# Altium schematic symbol library jlcpcb_2025_04_resistors_extended_0201.schlib: 1508 symbols (part 3 of 8) (continued)
## AF0201FR-07392KL
designator R?  Resistance: 392kΩ  (hidden comment: *)
Resistor, 392kΩ, ±1%, 50mW, 25V, ±200ppm/℃, -55℃~+155℃, SMD 0201; Manufacturer: Uniroyal; Manufacturer Part Number: AF0201FR-07392KL; Supplier 1: LCSC; Supplier Part Number 1: C143990; JLCPCB Part Number: C143990; Power Rating: 50mW; Category: Resistors; Package Size: 0201; JLCPCB Basic Part: Yes; Tolerance: ±1%; Voltage Rating: 25V; Temperature Coefficient: ±200ppm/℃; Temperature Rating: -55℃~+155℃; ComponentLink1Description: Datasheet; ComponentLink1URL: https://wmsc.lcsc.com/wmsc/upload/file/pdf/v2/lcsc/2304140030_YAGEO-AF0201FR-07392KL_C143990.pdf; ComponentLink2Description: JLCPCB Part URL; ComponentLink2URL: https://jlcpcb.com/partdetail/C143990
pins: 1, 2
1 alternate drawing of the same symbol

## AF0201FR-07422KL
designator R?  Resistance: 422kΩ  (hidden comment: *)
Resistor, 422kΩ, ±1%, 50mW, 25V, ±200ppm/℃, -55℃~+155℃, SMD 0201; Manufacturer: Uniroyal; Manufacturer Part Number: AF0201FR-07422KL; Supplier 1: LCSC; Supplier Part Number 1: C143991; JLCPCB Part Number: C143991; Power Rating: 50mW; Category: Resistors; Package Size: 0201; JLCPCB Basic Part: Yes; Tolerance: ±1%; Voltage Rating: 25V; Temperature Coefficient: ±200ppm/℃; Temperature Rating: -55℃~+155℃; ComponentLink1Description: Datasheet; ComponentLink1URL: https://wmsc.lcsc.com/wmsc/upload/file/pdf/v2/lcsc/2304140030_YAGEO-AF0201FR-07422KL_C143991.pdf; ComponentLink2Description: JLCPCB Part URL; ComponentLink2URL: https://jlcpcb.com/partdetail/C143991
pins: 1, 2
1 alternate drawing of the same symbol

## AF0201FR-07475RL
designator R?  Resistance: 475Ω  (hidden comment: *)
Resistor, 475Ω, ±1%, 50mW, 25V, ±200ppm/℃, -55℃~+155℃, SMD 0201; Manufacturer: Uniroyal; Manufacturer Part Number: AF0201FR-07475RL; Supplier 1: LCSC; Supplier Part Number 1: C143992; JLCPCB Part Number: C143992; Power Rating: 50mW; Category: Resistors; Package Size: 0201; JLCPCB Basic Part: Yes; Tolerance: ±1%; Voltage Rating: 25V; Temperature Coefficient: ±200ppm/℃; Temperature Rating: -55℃~+155℃; ComponentLink1Description: Datasheet; ComponentLink1URL: https://wmsc.lcsc.com/wmsc/upload/file/pdf/v2/lcsc/2304140030_YAGEO-AF0201FR-07475RL_C143992.pdf; ComponentLink2Description: JLCPCB Part URL; ComponentLink2URL: https://jlcpcb.com/partdetail/C143992
pins: 1, 2
1 alternate drawing of the same symbol

## AF0201JR-077K5L
designator R?  Resistance: 7.5kΩ  (hidden comment: *)
Resistor, 7.5kΩ, ±5%, 50mW, 25V, ±200ppm/℃, -55℃~+155℃, SMD 0201; Manufacturer: Uniroyal; Manufacturer Part Number: AF0201JR-077K5L; Supplier 1: LCSC; Supplier Part Number 1: C144029; JLCPCB Part Number: C144029; Power Rating: 50mW; Category: Resistors; Package Size: 0201; JLCPCB Basic Part: Yes; Tolerance: ±5%; Voltage Rating: 25V; Temperature Coefficient: ±200ppm/℃; Temperature Rating: -55℃~+155℃; ComponentLink1Description: Datasheet; ComponentLink1URL: https://wmsc.lcsc.com/wmsc/upload/file/pdf/v2/lcsc/2304140030_YAGEO-AF0201JR-077K5L_C144029.pdf; ComponentLink2Description: JLCPCB Part URL; ComponentLink2URL: https://jlcpcb.com/partdetail/C144029
pins: 1, 2
1 alternate drawing of the same symbol

## AF0201JR-0715KL
designator R?  Resistance: 15kΩ  (hidden comment: *)
Resistor, 15kΩ, ±5%, 50mW, 25V, ±200ppm/℃, -55℃~+125℃, SMD 0201; Manufacturer: Uniroyal; Manufacturer Part Number: AF0201JR-0715KL; Supplier 1: LCSC; Supplier Part Number 1: C144002; JLCPCB Part Number: C144002; Power Rating: 50mW; Category: Resistors; Package Size: 0201; JLCPCB Basic Part: Yes; Tolerance: ±5%; Voltage Rating: 25V; Temperature Coefficient: ±200ppm/℃; Temperature Rating: -55℃~+125℃; ComponentLink1Description: Datasheet; ComponentLink1URL: https://wmsc.lcsc.com/wmsc/upload/file/pdf/v2/lcsc/2304140030_YAGEO-AF0201JR-0715KL_C144002.pdf; ComponentLink2Description: JLCPCB Part URL; ComponentLink2URL: https://jlcpcb.com/partdetail/C144002
pins: 1, 2
1 alternate drawing of the same symbol

## AF0201JR-0720KL
designator R?  Resistance: 20kΩ  (hidden comment: *)
Resistor, 20kΩ, ±5%, 50mW, 25V, ±200ppm/℃, -55℃~+125℃, SMD 0201; Manufacturer: Uniroyal; Manufacturer Part Number: AF0201JR-0720KL; Supplier 1: LCSC; Supplier Part Number 1: C144008; JLCPCB Part Number: C144008; Power Rating: 50mW; Category: Resistors; Package Size: 0201; JLCPCB Basic Part: Yes; Tolerance: ±5%; Voltage Rating: 25V; Temperature Coefficient: ±200ppm/℃; Temperature Rating: -55℃~+125℃; ComponentLink1Description: Datasheet; ComponentLink1URL: https://wmsc.lcsc.com/wmsc/upload/file/pdf/v2/lcsc/2304140030_YAGEO-AF0201JR-0720KL_C144008.pdf; ComponentLink2Description: JLCPCB Part URL; ComponentLink2URL: https://jlcpcb.com/partdetail/C144008
pins: 1, 2
1 alternate drawing of the same symbol

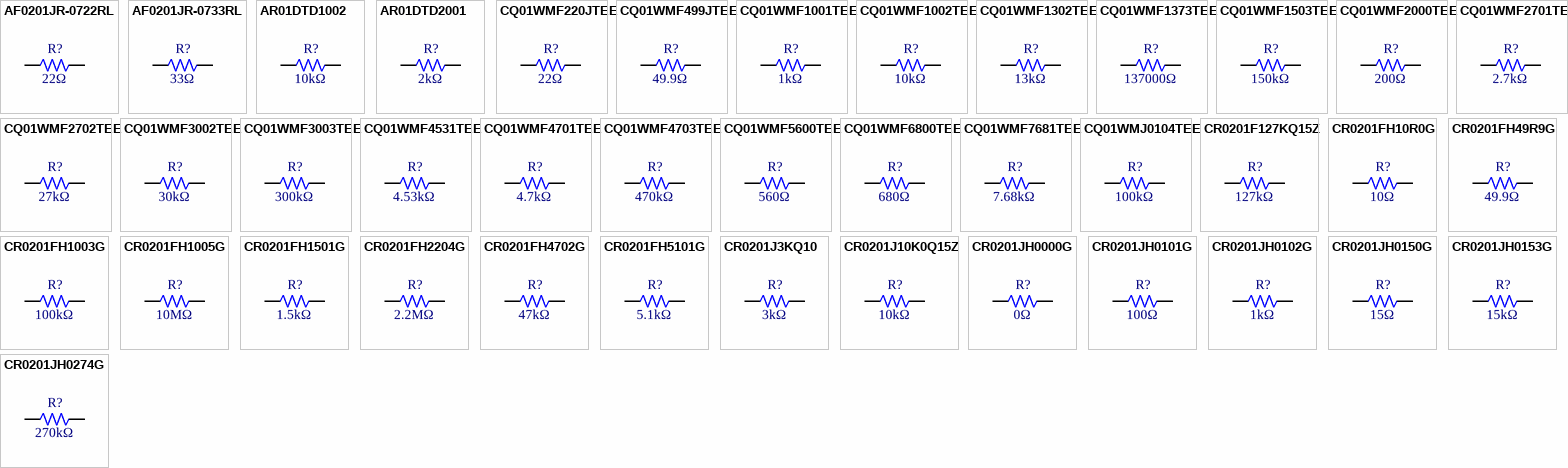
[diagram p11: symbols AF0201JR-0722RL to CR0201JH0274G]

## AF0201JR-0722RL
designator R?  Resistance: 22Ω  (hidden comment: *)
Resistor, 22Ω, ±5%, 50mW, 25V, ±200ppm/℃, -55℃~+125℃, SMD 0201; Manufacturer: Uniroyal; Manufacturer Part Number: AF0201JR-0722RL; Supplier 1: LCSC; Supplier Part Number 1: C144010; JLCPCB Part Number: C144010; Power Rating: 50mW; Category: Resistors; Package Size: 0201; JLCPCB Basic Part: Yes; Tolerance: ±5%; Voltage Rating: 25V; Temperature Coefficient: ±200ppm/℃; Temperature Rating: -55℃~+125℃; ComponentLink1Description: Datasheet; ComponentLink1URL: https://wmsc.lcsc.com/wmsc/upload/file/pdf/v2/lcsc/2304140030_YAGEO-AF0201JR-0722RL_C144010.pdf; ComponentLink2Description: JLCPCB Part URL; ComponentLink2URL: https://jlcpcb.com/partdetail/C144010
pins: 1, 2
1 alternate drawing of the same symbol

## AF0201JR-0733RL
designator R?  Resistance: 33Ω  (hidden comment: *)
Resistor, 33Ω, ±5%, 50mW, 25V, ±200ppm/℃, -55℃~+125℃, SMD 0201; Manufacturer: Uniroyal; Manufacturer Part Number: AF0201JR-0733RL; Supplier 1: LCSC; Supplier Part Number 1: C144015; JLCPCB Part Number: C144015; Power Rating: 50mW; Category: Resistors; Package Size: 0201; JLCPCB Basic Part: Yes; Tolerance: ±5%; Voltage Rating: 25V; Temperature Coefficient: ±200ppm/℃; Temperature Rating: -55℃~+125℃; ComponentLink1Description: Datasheet; ComponentLink1URL: https://wmsc.lcsc.com/wmsc/upload/file/pdf/v2/lcsc/2304140030_YAGEO-AF0201JR-0733RL_C144015.pdf; ComponentLink2Description: JLCPCB Part URL; ComponentLink2URL: https://jlcpcb.com/partdetail/C144015
pins: 1, 2
1 alternate drawing of the same symbol

## AR01DTD1002
designator R?  Resistance: 10kΩ  (hidden comment: *)
Resistor, 10kΩ, ±0.5%, 31.25mW, 15V, ±50ppm/℃, -55℃~+155℃, SMD 0201; Manufacturer: Uniroyal; Manufacturer Part Number: AR01DTD1002; Supplier 1: LCSC; Supplier Part Number 1: C319932; JLCPCB Part Number: C319932; Power Rating: 31.25mW; Category: Resistors; Package Size: 0201; JLCPCB Basic Part: Yes; Tolerance: ±0.5%; Voltage Rating: 15V; Temperature Coefficient: ±50ppm/℃; Temperature Rating: -55℃~+155℃; ComponentLink1Description: Datasheet; ComponentLink1URL: https://wmsc.lcsc.com/wmsc/upload/file/pdf/v2/lcsc/2304140030_Viking-Tech-AR01DTD1002_C319932.pdf; ComponentLink2Description: JLCPCB Part URL; ComponentLink2URL: https://jlcpcb.com/partdetail/C319932
pins: 1, 2
1 alternate drawing of the same symbol

## AR01DTD2001
designator R?  Resistance: 2kΩ  (hidden comment: *)
Resistor, 2kΩ, ±0.5%, 31.25mW, 15V, ±50ppm/℃, -55℃~+155℃, SMD 0201; Manufacturer: Uniroyal; Manufacturer Part Number: AR01DTD2001; Supplier 1: LCSC; Supplier Part Number 1: C319695; JLCPCB Part Number: C319695; Power Rating: 31.25mW; Category: Resistors; Package Size: 0201; JLCPCB Basic Part: Yes; Tolerance: ±0.5%; Voltage Rating: 15V; Temperature Coefficient: ±50ppm/℃; Temperature Rating: -55℃~+155℃; ComponentLink1Description: Datasheet; ComponentLink1URL: https://wmsc.lcsc.com/wmsc/upload/file/pdf/v2/lcsc/2304140030_Viking-Tech-AR01DTD2001_C319695.pdf; ComponentLink2Description: JLCPCB Part URL; ComponentLink2URL: https://jlcpcb.com/partdetail/C319695
pins: 1, 2
1 alternate drawing of the same symbol

## CQ01WMF220JTEE
designator R?  Resistance: 22Ω  (hidden comment: *)
Resistor, 22Ω, ±1%, 50mW, 25V, -55℃~+155℃, SMD 0201; Manufacturer: Uniroyal; Manufacturer Part Number: CQ01WMF220JTEE; Supplier 1: LCSC; Supplier Part Number 1: C2770592; JLCPCB Part Number: C2770592; Power Rating: 50mW; Category: Resistors; Package Size: 0201; JLCPCB Basic Part: Yes; Tolerance: ±1%; Voltage Rating: 25V; Temperature Rating: -55℃~+155℃; ComponentLink1Description: Datasheet; ComponentLink1URL: https://wmsc.lcsc.com/wmsc/upload/file/pdf/v2/lcsc/2304140030_UNI-ROYAL-Uniroyal-Elec-CQ01WMF220JTEE_C2770592.pdf; ComponentLink2Description: JLCPCB Part URL; ComponentLink2URL: https://jlcpcb.com/partdetail/C2770592
pins: 1, 2
1 alternate drawing of the same symbol

## CQ01WMF499JTEE
designator R?  Resistance: 49.9Ω  (hidden comment: *)
Resistor, 49.9Ω, ±1%, 50mW, 25V, -55℃~+155℃, SMD 0201; Manufacturer: Uniroyal; Manufacturer Part Number: CQ01WMF499JTEE; Supplier 1: LCSC; Supplier Part Number 1: C2759808; JLCPCB Part Number: C2759808; Power Rating: 50mW; Category: Resistors; Package Size: 0201; JLCPCB Basic Part: Yes; Tolerance: ±1%; Voltage Rating: 25V; Temperature Rating: -55℃~+155℃; ComponentLink1Description: Datasheet; ComponentLink1URL: https://wmsc.lcsc.com/wmsc/upload/file/pdf/v2/lcsc/2304140030_UNI-ROYAL-Uniroyal-Elec-CQ01WMF499JTEE_C2759808.pdf; ComponentLink2Description: JLCPCB Part URL; ComponentLink2URL: https://jlcpcb.com/partdetail/C2759808
pins: 1, 2
1 alternate drawing of the same symbol

## CQ01WMF1001TEE
designator R?  Resistance: 1kΩ  (hidden comment: *)
Resistor, 1kΩ, ±1%, 50mW, 25V, ±200ppm/℃, -55℃~+155℃, SMD 0201; Manufacturer: Uniroyal; Manufacturer Part Number: CQ01WMF1001TEE; Supplier 1: LCSC; Supplier Part Number 1: C966897; JLCPCB Part Number: C966897; Power Rating: 50mW; Category: Resistors; Package Size: 0201; JLCPCB Basic Part: Yes; Tolerance: ±1%; Voltage Rating: 25V; Temperature Coefficient: ±200ppm/℃; Temperature Rating: -55℃~+155℃; ComponentLink1Description: Datasheet; ComponentLink1URL: https://wmsc.lcsc.com/wmsc/upload/file/pdf/v2/lcsc/2304140030_UNI-ROYAL-Uniroyal-Elec-CQ01WMF1001TEE_C966897.pdf; ComponentLink2Description: JLCPCB Part URL; ComponentLink2URL: https://jlcpcb.com/partdetail/C966897
pins: 1, 2
1 alternate drawing of the same symbol

## CQ01WMF1002TEE
designator R?  Resistance: 10kΩ  (hidden comment: *)
Resistor, 10kΩ, ±1%, 50mW, 25V, ±200ppm/℃, -55℃~+155℃, SMD 0201; Manufacturer: Uniroyal; Manufacturer Part Number: CQ01WMF1002TEE; Supplier 1: LCSC; Supplier Part Number 1: C2770581; JLCPCB Part Number: C2770581; Power Rating: 50mW; Category: Resistors; Package Size: 0201; JLCPCB Basic Part: Yes; Tolerance: ±1%; Voltage Rating: 25V; Temperature Coefficient: ±200ppm/℃; Temperature Rating: -55℃~+155℃; ComponentLink1Description: Datasheet; ComponentLink1URL: https://wmsc.lcsc.com/wmsc/upload/file/pdf/v2/lcsc/2304140030_UNI-ROYAL-Uniroyal-Elec-CQ01WMF1002TEE_C2770581.pdf; ComponentLink2Description: JLCPCB Part URL; ComponentLink2URL: https://jlcpcb.com/partdetail/C2770581
pins: 1, 2
1 alternate drawing of the same symbol

## CQ01WMF1302TEE
designator R?  Resistance: 13kΩ  (hidden comment: *)
Resistor, 13kΩ, ±1%, 50mW, ±200ppm/℃, SMD 0201; Manufacturer: Uniroyal; Manufacturer Part Number: CQ01WMF1302TEE; Supplier 1: LCSC; Supplier Part Number 1: C966894; JLCPCB Part Number: C966894; Power Rating: 50mW; Category: Resistors; Package Size: 0201; JLCPCB Basic Part: Yes; Tolerance: ±1%; Temperature Coefficient: ±200ppm/℃; ComponentLink1Description: Datasheet; ComponentLink1URL: https://wmsc.lcsc.com/wmsc/upload/file/pdf/v2/lcsc/2304140030_UNI-ROYAL-Uniroyal-Elec-CQ01WMF1302TEE_C966894.pdf; ComponentLink2Description: JLCPCB Part URL; ComponentLink2URL: https://jlcpcb.com/partdetail/C966894
pins: 1, 2
1 alternate drawing of the same symbol

## CQ01WMF1373TEE
designator R?  Resistance: 137000Ω  (hidden comment: *)
Resistor, 137000Ω, ±1%, 50mW, 25V, ±200ppm/℃, -55℃~+155℃, SMD 0201; Manufacturer: Uniroyal; Manufacturer Part Number: CQ01WMF1373TEE; Supplier 1: LCSC; Supplier Part Number 1: C966893; JLCPCB Part Number: C966893; Power Rating: 50mW; Category: Resistors; Package Size: 0201; JLCPCB Basic Part: Yes; Tolerance: ±1%; Voltage Rating: 25V; Temperature Coefficient: ±200ppm/℃; Temperature Rating: -55℃~+155℃; ComponentLink1Description: Datasheet; ComponentLink1URL: https://wmsc.lcsc.com/wmsc/upload/file/pdf/v2/lcsc/2304140030_UNI-ROYAL-Uniroyal-Elec-CQ01WMF1373TEE_C966893.pdf; ComponentLink2Description: JLCPCB Part URL; ComponentLink2URL: https://jlcpcb.com/partdetail/C966893
pins: 1, 2
1 alternate drawing of the same symbol

## CQ01WMF1503TEE
designator R?  Resistance: 150kΩ  (hidden comment: *)
Resistor, 150kΩ, ±1%, 50mW, 25V, -55℃~+155℃, SMD 0201; Manufacturer: Uniroyal; Manufacturer Part Number: CQ01WMF1503TEE; Supplier 1: LCSC; Supplier Part Number 1: C2770589; JLCPCB Part Number: C2770589; Power Rating: 50mW; Category: Resistors; Package Size: 0201; JLCPCB Basic Part: Yes; Tolerance: ±1%; Voltage Rating: 25V; Temperature Rating: -55℃~+155℃; ComponentLink1Description: Datasheet; ComponentLink1URL: https://wmsc.lcsc.com/wmsc/upload/file/pdf/v2/lcsc/2304140030_UNI-ROYAL-Uniroyal-Elec-CQ01WMF1503TEE_C2770589.pdf; ComponentLink2Description: JLCPCB Part URL; ComponentLink2URL: https://jlcpcb.com/partdetail/C2770589
pins: 1, 2
1 alternate drawing of the same symbol

## CQ01WMF2000TEE
designator R?  Resistance: 200Ω  (hidden comment: *)
Resistor, 200Ω, ±1%, 50mW, 25V, ±200ppm/℃, -55℃~+155℃, SMD 0201; Manufacturer: Uniroyal; Manufacturer Part Number: CQ01WMF2000TEE; Supplier 1: LCSC; Supplier Part Number 1: C966892; JLCPCB Part Number: C966892; Power Rating: 50mW; Category: Resistors; Package Size: 0201; JLCPCB Basic Part: Yes; Tolerance: ±1%; Voltage Rating: 25V; Temperature Coefficient: ±200ppm/℃; Temperature Rating: -55℃~+155℃; ComponentLink1Description: Datasheet; ComponentLink1URL: https://wmsc.lcsc.com/wmsc/upload/file/pdf/v2/lcsc/2304140030_UNI-ROYAL-Uniroyal-Elec-CQ01WMF2000TEE_C966892.pdf; ComponentLink2Description: JLCPCB Part URL; ComponentLink2URL: https://jlcpcb.com/partdetail/C966892
pins: 1, 2
1 alternate drawing of the same symbol

## CQ01WMF2701TEE
designator R?  Resistance: 2.7kΩ  (hidden comment: *)
Resistor, 2.7kΩ, ±1%, 50mW, 25V, ±200ppm/℃, -55℃~+155℃, SMD 0201; Manufacturer: Uniroyal; Manufacturer Part Number: CQ01WMF2701TEE; Supplier 1: LCSC; Supplier Part Number 1: C966888; JLCPCB Part Number: C966888; Power Rating: 50mW; Category: Resistors; Package Size: 0201; JLCPCB Basic Part: Yes; Tolerance: ±1%; Voltage Rating: 25V; Temperature Coefficient: ±200ppm/℃; Temperature Rating: -55℃~+155℃; ComponentLink1Description: Datasheet; ComponentLink1URL: https://wmsc.lcsc.com/wmsc/upload/file/pdf/v2/lcsc/2304140030_UNI-ROYAL-Uniroyal-Elec-CQ01WMF2701TEE_C966888.pdf; ComponentLink2Description: JLCPCB Part URL; ComponentLink2URL: https://jlcpcb.com/partdetail/C966888
pins: 1, 2
1 alternate drawing of the same symbol

## CQ01WMF2702TEE
designator R?  Resistance: 27kΩ  (hidden comment: *)
Resistor, 27kΩ, ±1%, 50mW, 25V, ±200ppm/℃, -55℃~+155℃, SMD 0201; Manufacturer: Uniroyal; Manufacturer Part Number: CQ01WMF2702TEE; Supplier 1: LCSC; Supplier Part Number 1: C2770595; JLCPCB Part Number: C2770595; Power Rating: 50mW; Category: Resistors; Package Size: 0201; JLCPCB Basic Part: Yes; Tolerance: ±1%; Voltage Rating: 25V; Temperature Coefficient: ±200ppm/℃; Temperature Rating: -55℃~+155℃; ComponentLink1Description: Datasheet; ComponentLink1URL: https://wmsc.lcsc.com/wmsc/upload/file/pdf/v2/lcsc/2304140030_UNI-ROYAL-Uniroyal-Elec-CQ01WMF2702TEE_C2770595.pdf; ComponentLink2Description: JLCPCB Part URL; ComponentLink2URL: https://jlcpcb.com/partdetail/C2770595
pins: 1, 2
1 alternate drawing of the same symbol

## CQ01WMF3002TEE
designator R?  Resistance: 30kΩ  (hidden comment: *)
Resistor, 30kΩ, ±1%, 50mW, 25V, ±200ppm/℃, -55℃~+155℃, SMD 0201; Manufacturer: Uniroyal; Manufacturer Part Number: CQ01WMF3002TEE; Supplier 1: LCSC; Supplier Part Number 1: C2770597; JLCPCB Part Number: C2770597; Power Rating: 50mW; Category: Resistors; Package Size: 0201; JLCPCB Basic Part: Yes; Tolerance: ±1%; Voltage Rating: 25V; Temperature Coefficient: ±200ppm/℃; Temperature Rating: -55℃~+155℃; ComponentLink1Description: Datasheet; ComponentLink1URL: https://wmsc.lcsc.com/wmsc/upload/file/pdf/v2/lcsc/2304140030_UNI-ROYAL-Uniroyal-Elec-CQ01WMF3002TEE_C2770597.pdf; ComponentLink2Description: JLCPCB Part URL; ComponentLink2URL: https://jlcpcb.com/partdetail/C2770597
pins: 1, 2
1 alternate drawing of the same symbol

## CQ01WMF3003TEE
designator R?  Resistance: 300kΩ  (hidden comment: *)
Resistor, 300kΩ, ±1%, 50mW, 25V, ±200ppm/℃, -55℃~+155℃, SMD 0201; Manufacturer: Uniroyal; Manufacturer Part Number: CQ01WMF3003TEE; Supplier 1: LCSC; Supplier Part Number 1: C2770598; JLCPCB Part Number: C2770598; Power Rating: 50mW; Category: Resistors; Package Size: 0201; JLCPCB Basic Part: Yes; Tolerance: ±1%; Voltage Rating: 25V; Temperature Coefficient: ±200ppm/℃; Temperature Rating: -55℃~+155℃; ComponentLink1Description: Datasheet; ComponentLink1URL: https://wmsc.lcsc.com/wmsc/upload/file/pdf/v2/lcsc/2304140030_UNI-ROYAL-Uniroyal-Elec-CQ01WMF3003TEE_C2770598.pdf; ComponentLink2Description: JLCPCB Part URL; ComponentLink2URL: https://jlcpcb.com/partdetail/C2770598
pins: 1, 2
1 alternate drawing of the same symbol

## CQ01WMF4531TEE
designator R?  Resistance: 4.53kΩ  (hidden comment: *)
Resistor, 4.53kΩ, ±1%, 50mW, 25V, -55℃~+155℃, SMD 0201; Manufacturer: Uniroyal; Manufacturer Part Number: CQ01WMF4531TEE; Supplier 1: LCSC; Supplier Part Number 1: C2759809; JLCPCB Part Number: C2759809; Power Rating: 50mW; Category: Resistors; Package Size: 0201; JLCPCB Basic Part: Yes; Tolerance: ±1%; Voltage Rating: 25V; Temperature Rating: -55℃~+155℃; ComponentLink1Description: Datasheet; ComponentLink1URL: https://wmsc.lcsc.com/wmsc/upload/file/pdf/v2/lcsc/2106062211_UNI-ROYAL-Uniroyal-Elec-CQ01WMF4531TEE_C2759809.pdf; ComponentLink2Description: JLCPCB Part URL; ComponentLink2URL: https://jlcpcb.com/partdetail/C2759809
pins: 1, 2
1 alternate drawing of the same symbol

## CQ01WMF4701TEE
designator R?  Resistance: 4.7kΩ  (hidden comment: *)
Resistor, 4.7kΩ, ±1%, 50mW, 25V, -55℃~+155℃, SMD 0201; Manufacturer: Uniroyal; Manufacturer Part Number: CQ01WMF4701TEE; Supplier 1: LCSC; Supplier Part Number 1: C2770602; JLCPCB Part Number: C2770602; Power Rating: 50mW; Category: Resistors; Package Size: 0201; JLCPCB Basic Part: Yes; Tolerance: ±1%; Voltage Rating: 25V; Temperature Rating: -55℃~+155℃; ComponentLink1Description: Datasheet; ComponentLink1URL: https://wmsc.lcsc.com/wmsc/upload/file/pdf/v2/lcsc/2304140030_UNI-ROYAL-Uniroyal-Elec-CQ01WMF4701TEE_C2770602.pdf; ComponentLink2Description: JLCPCB Part URL; ComponentLink2URL: https://jlcpcb.com/partdetail/C2770602
pins: 1, 2
1 alternate drawing of the same symbol

## CQ01WMF4703TEE
designator R?  Resistance: 470kΩ  (hidden comment: *)
Resistor, 470kΩ, ±1%, 50mW, 25V, ±200ppm/℃, -55℃~+155℃, SMD 0201; Manufacturer: Uniroyal; Manufacturer Part Number: CQ01WMF4703TEE; Supplier 1: LCSC; Supplier Part Number 1: C966885; JLCPCB Part Number: C966885; Power Rating: 50mW; Category: Resistors; Package Size: 0201; JLCPCB Basic Part: Yes; Tolerance: ±1%; Voltage Rating: 25V; Temperature Coefficient: ±200ppm/℃; Temperature Rating: -55℃~+155℃; ComponentLink1Description: Datasheet; ComponentLink1URL: https://wmsc.lcsc.com/wmsc/upload/file/pdf/v2/lcsc/2304140030_UNI-ROYAL-Uniroyal-Elec-CQ01WMF4703TEE_C966885.pdf; ComponentLink2Description: JLCPCB Part URL; ComponentLink2URL: https://jlcpcb.com/partdetail/C966885
pins: 1, 2
1 alternate drawing of the same symbol

## CQ01WMF5600TEE
designator R?  Resistance: 560Ω  (hidden comment: *)
Resistor, 560Ω, ±1%, 50mW, 25V, ±200ppm/℃, -55℃~+155℃, SMD 0201; Manufacturer: Uniroyal; Manufacturer Part Number: CQ01WMF5600TEE; Supplier 1: LCSC; Supplier Part Number 1: C2759807; JLCPCB Part Number: C2759807; Power Rating: 50mW; Category: Resistors; Package Size: 0201; JLCPCB Basic Part: Yes; Tolerance: ±1%; Voltage Rating: 25V; Temperature Coefficient: ±200ppm/℃; Temperature Rating: -55℃~+155℃; ComponentLink1Description: Datasheet; ComponentLink1URL: https://wmsc.lcsc.com/wmsc/upload/file/pdf/v2/lcsc/2304140030_UNI-ROYAL-Uniroyal-Elec-CQ01WMF5600TEE_C2759807.pdf; ComponentLink2Description: JLCPCB Part URL; ComponentLink2URL: https://jlcpcb.com/partdetail/C2759807
pins: 1, 2
1 alternate drawing of the same symbol

## CQ01WMF6800TEE
designator R?  Resistance: 680Ω  (hidden comment: *)
Resistor, 680Ω, ±1%, 50mW, 25V, -55℃~+155℃, SMD 0201; Manufacturer: Uniroyal; Manufacturer Part Number: CQ01WMF6800TEE; Supplier 1: LCSC; Supplier Part Number 1: C2770606; JLCPCB Part Number: C2770606; Power Rating: 50mW; Category: Resistors; Package Size: 0201; JLCPCB Basic Part: Yes; Tolerance: ±1%; Voltage Rating: 25V; Temperature Rating: -55℃~+155℃; ComponentLink1Description: Datasheet; ComponentLink1URL: https://wmsc.lcsc.com/wmsc/upload/file/pdf/v2/lcsc/2304140030_UNI-ROYAL-Uniroyal-Elec-CQ01WMF6800TEE_C2770606.pdf; ComponentLink2Description: JLCPCB Part URL; ComponentLink2URL: https://jlcpcb.com/partdetail/C2770606
pins: 1, 2
1 alternate drawing of the same symbol

## CQ01WMF7681TEE
designator R?  Resistance: 7.68kΩ  (hidden comment: *)
Resistor, 7.68kΩ, ±1%, 50mW, SMD 0201; Manufacturer: Uniroyal; Manufacturer Part Number: CQ01WMF7681TEE; Supplier 1: LCSC; Supplier Part Number 1: C5151550; JLCPCB Part Number: C5151550; Power Rating: 50mW; Category: Resistors; Package Size: 0201; JLCPCB Basic Part: Yes; Tolerance: ±1%; ComponentLink1Description: Datasheet; ComponentLink1URL: https://wmsc.lcsc.com/wmsc/upload/file/pdf/v2/lcsc/2210101800_UNI-ROYAL-Uniroyal-Elec-CQ01WMF7681TEE_C5151550.pdf; ComponentLink2Description: JLCPCB Part URL; ComponentLink2URL: https://jlcpcb.com/partdetail/C5151550
pins: 1, 2
1 alternate drawing of the same symbol

## CQ01WMJ0104TEE
designator R?  Resistance: 100kΩ  (hidden comment: *)
Resistor, 100kΩ, ±5%, 50mW, SMD 0201; Manufacturer: Uniroyal; Manufacturer Part Number: CQ01WMJ0104TEE; Supplier 1: LCSC; Supplier Part Number 1: C5151553; JLCPCB Part Number: C5151553; Power Rating: 50mW; Category: Resistors; Package Size: 0201; JLCPCB Basic Part: Yes; Tolerance: ±5%; ComponentLink1Description: Datasheet; ComponentLink1URL: https://wmsc.lcsc.com/wmsc/upload/file/pdf/v2/lcsc/2210101800_UNI-ROYAL-Uniroyal-Elec-CQ01WMJ0104TEE_C5151553.pdf; ComponentLink2Description: JLCPCB Part URL; ComponentLink2URL: https://jlcpcb.com/partdetail/C5151553
pins: 1, 2
1 alternate drawing of the same symbol

## CR0201F127KQ15Z
designator R?  Resistance: 127kΩ  (hidden comment: *)
Resistor, 127kΩ, ±1%, 50mW, ±200ppm/℃, -55℃~+155℃, SMD 0201; Manufacturer: Uniroyal; Manufacturer Part Number: CR0201F127KQ15Z; Supplier 1: LCSC; Supplier Part Number 1: C881246; JLCPCB Part Number: C881246; Power Rating: 50mW; Category: Resistors; Package Size: 0201; JLCPCB Basic Part: Yes; Tolerance: ±1%; Temperature Coefficient: ±200ppm/℃; Temperature Rating: -55℃~+155℃; ComponentLink1Description: Datasheet; ComponentLink1URL: https://wmsc.lcsc.com/wmsc/upload/file/pdf/v2/lcsc/2304140030_Ever-Ohms-Tech-CR0201F127KQ15Z_C881246.pdf; ComponentLink2Description: JLCPCB Part URL; ComponentLink2URL: https://jlcpcb.com/partdetail/C881246
pins: 1, 2
1 alternate drawing of the same symbol

## CR0201FH10R0G
designator R?  Resistance: 10Ω  (hidden comment: *)
Resistor, 10Ω, ±1%, 50mW, SMD 0201; Manufacturer: Uniroyal; Manufacturer Part Number: CR0201FH10R0G; Supplier 1: LCSC; Supplier Part Number 1: C105889; JLCPCB Part Number: C105889; Power Rating: 50mW; Category: Resistors; Package Size: 0201; JLCPCB Basic Part: Yes; Tolerance: ±1%; ComponentLink1Description: Datasheet; ComponentLink1URL: https://wmsc.lcsc.com/wmsc/upload/file/pdf/v2/lcsc/2304140030_LIZ-Elec-CR0201FH10R0G_C105889.pdf; ComponentLink2Description: JLCPCB Part URL; ComponentLink2URL: https://jlcpcb.com/partdetail/C105889
pins: 1, 2
1 alternate drawing of the same symbol

## CR0201FH49R9G
designator R?  Resistance: 49.9Ω  (hidden comment: *)
Resistor, 49.9Ω, ±1%, 50mW, 25V, ±250ppm/℃, -55℃~+125℃, SMD 0201; Manufacturer: Uniroyal; Manufacturer Part Number: CR0201FH49R9G; Supplier 1: LCSC; Supplier Part Number 1: C100141; JLCPCB Part Number: C100141; Power Rating: 50mW; Category: Resistors; Package Size: 0201; JLCPCB Basic Part: Yes; Tolerance: ±1%; Voltage Rating: 25V; Temperature Coefficient: ±250ppm/℃; Temperature Rating: -55℃~+125℃; ComponentLink1Description: Datasheet; ComponentLink1URL: https://wmsc.lcsc.com/wmsc/upload/file/pdf/v2/lcsc/2304140030_LIZ-Elec-CR0201FH49R9G_C100141.pdf; ComponentLink2Description: JLCPCB Part URL; ComponentLink2URL: https://jlcpcb.com/partdetail/C100141
pins: 1, 2
1 alternate drawing of the same symbol

## CR0201FH1003G
designator R?  Resistance: 100kΩ  (hidden comment: *)
Resistor, 100kΩ, ±1%, 50mW, ±250ppm/℃, SMD 0201; Manufacturer: Uniroyal; Manufacturer Part Number: CR0201FH1003G; Supplier 1: LCSC; Supplier Part Number 1: C100127; JLCPCB Part Number: C100127; Power Rating: 50mW; Category: Resistors; Package Size: 0201; JLCPCB Basic Part: Yes; Tolerance: ±1%; Temperature Coefficient: ±250ppm/℃; ComponentLink1Description: Datasheet; ComponentLink1URL: https://wmsc.lcsc.com/wmsc/upload/file/pdf/v2/lcsc/2304140030_LIZ-Elec-CR0201FH1003G_C100127.pdf; ComponentLink2Description: JLCPCB Part URL; ComponentLink2URL: https://jlcpcb.com/partdetail/C100127
pins: 1, 2
1 alternate drawing of the same symbol

## CR0201FH1005G
designator R?  Resistance: 10MΩ  (hidden comment: *)
Resistor, 10MΩ, ±1%, 50mW, 25V, SMD 0201; Manufacturer: Uniroyal; Manufacturer Part Number: CR0201FH1005G; Supplier 1: LCSC; Supplier Part Number 1: C3036920; JLCPCB Part Number: C3036920; Power Rating: 50mW; Category: Resistors; Package Size: 0201; JLCPCB Basic Part: Yes; Tolerance: ±1%; Voltage Rating: 25V; ComponentLink1Description: Datasheet; ComponentLink1URL: https://wmsc.lcsc.com/wmsc/upload/file/pdf/v2/lcsc/2206291630_LIZ-Elec-CR0201FH1005G_C3036920.pdf; ComponentLink2Description: JLCPCB Part URL; ComponentLink2URL: https://jlcpcb.com/partdetail/C3036920
pins: 1, 2
1 alternate drawing of the same symbol

## CR0201FH1501G
designator R?  Resistance: 1.5kΩ  (hidden comment: *)
Resistor, 1.5kΩ, ±1%, 50mW, 25V, SMD 0201; Manufacturer: Uniroyal; Manufacturer Part Number: CR0201FH1501G; Supplier 1: LCSC; Supplier Part Number 1: C3037193; JLCPCB Part Number: C3037193; Power Rating: 50mW; Category: Resistors; Package Size: 0201; JLCPCB Basic Part: Yes; Tolerance: ±1%; Voltage Rating: 25V; ComponentLink1Description: Datasheet; ComponentLink1URL: https://wmsc.lcsc.com/wmsc/upload/file/pdf/v2/lcsc/2207051802_LIZ-Elec-CR0201FH1501G_C3037193.pdf; ComponentLink2Description: JLCPCB Part URL; ComponentLink2URL: https://jlcpcb.com/partdetail/C3037193
pins: 1, 2
1 alternate drawing of the same symbol

## CR0201FH2204G
designator R?  Resistance: 2.2MΩ  (hidden comment: *)
Resistor, 2.2MΩ, ±1%, 50mW, 25V, SMD 0201; Manufacturer: Uniroyal; Manufacturer Part Number: CR0201FH2204G; Supplier 1: LCSC; Supplier Part Number 1: C3036951; JLCPCB Part Number: C3036951; Power Rating: 50mW; Category: Resistors; Package Size: 0201; JLCPCB Basic Part: Yes; Tolerance: ±1%; Voltage Rating: 25V; ComponentLink1Description: Datasheet; ComponentLink1URL: https://wmsc.lcsc.com/wmsc/upload/file/pdf/v2/lcsc/2206301600_LIZ-Elec-CR0201FH2204G_C3036951.pdf; ComponentLink2Description: JLCPCB Part URL; ComponentLink2URL: https://jlcpcb.com/partdetail/C3036951
pins: 1, 2
1 alternate drawing of the same symbol

## CR0201FH4702G
designator R?  Resistance: 47kΩ  (hidden comment: *)
Resistor, 47kΩ, ±1%, 50mW, 25V, ±250ppm/℃, -55℃~+125℃, SMD 0201; Manufacturer: Uniroyal; Manufacturer Part Number: CR0201FH4702G; Supplier 1: LCSC; Supplier Part Number 1: C100140; JLCPCB Part Number: C100140; Power Rating: 50mW; Category: Resistors; Package Size: 0201; JLCPCB Basic Part: Yes; Tolerance: ±1%; Voltage Rating: 25V; Temperature Coefficient: ±250ppm/℃; Temperature Rating: -55℃~+125℃; ComponentLink1Description: Datasheet; ComponentLink1URL: https://wmsc.lcsc.com/wmsc/upload/file/pdf/v2/lcsc/2304140030_LIZ-Elec-CR0201FH4702G_C100140.pdf; ComponentLink2Description: JLCPCB Part URL; ComponentLink2URL: https://jlcpcb.com/partdetail/C100140
pins: 1, 2
1 alternate drawing of the same symbol

## CR0201FH5101G
designator R?  Resistance: 5.1kΩ  (hidden comment: *)
Resistor, 5.1kΩ, ±1%, 50mW, 25V, ±250ppm/℃, -55℃~+125℃, SMD 0201; Manufacturer: Uniroyal; Manufacturer Part Number: CR0201FH5101G; Supplier 1: LCSC; Supplier Part Number 1: C100142; JLCPCB Part Number: C100142; Power Rating: 50mW; Category: Resistors; Package Size: 0201; JLCPCB Basic Part: Yes; Tolerance: ±1%; Voltage Rating: 25V; Temperature Coefficient: ±250ppm/℃; Temperature Rating: -55℃~+125℃; ComponentLink1Description: Datasheet; ComponentLink1URL: https://wmsc.lcsc.com/wmsc/upload/file/pdf/v2/lcsc/2304140030_LIZ-Elec-CR0201FH5101G_C100142.pdf; ComponentLink2Description: JLCPCB Part URL; ComponentLink2URL: https://jlcpcb.com/partdetail/C100142
pins: 1, 2
1 alternate drawing of the same symbol

## CR0201J3KQ10
designator R?  Resistance: 3kΩ  (hidden comment: *)
Resistor, 3kΩ, ±5%, 50mW, 25V, ±200ppm/℃, -55℃~+155℃, SMD 0201; Manufacturer: Uniroyal; Manufacturer Part Number: CR0201J3KQ10; Supplier 1: LCSC; Supplier Part Number 1: C245039; JLCPCB Part Number: C245039; Power Rating: 50mW; Category: Resistors; Package Size: 0201; JLCPCB Basic Part: Yes; Tolerance: ±5%; Voltage Rating: 25V; Temperature Coefficient: ±200ppm/℃; Temperature Rating: -55℃~+155℃; ComponentLink1Description: Datasheet; ComponentLink1URL: https://wmsc.lcsc.com/wmsc/upload/file/pdf/v2/lcsc/2304140030_Ever-Ohms-Tech-CR0201J3KQ10_C245039.pdf; ComponentLink2Description: JLCPCB Part URL; ComponentLink2URL: https://jlcpcb.com/partdetail/C245039
pins: 1, 2
1 alternate drawing of the same symbol

## CR0201J10K0Q15Z
designator R?  Resistance: 10kΩ  (hidden comment: *)
Resistor, 10kΩ, ±5%, 50mW, ±200ppm/℃, -55℃~+155℃, SMD 0201; Manufacturer: Uniroyal; Manufacturer Part Number: CR0201J10K0Q15Z; Supplier 1: LCSC; Supplier Part Number 1: C881285; JLCPCB Part Number: C881285; Power Rating: 50mW; Category: Resistors; Package Size: 0201; JLCPCB Basic Part: Yes; Tolerance: ±5%; Temperature Coefficient: ±200ppm/℃; Temperature Rating: -55℃~+155℃; ComponentLink1Description: Datasheet; ComponentLink1URL: https://wmsc.lcsc.com/wmsc/upload/file/pdf/v2/lcsc/2304140030_Ever-Ohms-Tech-CR0201J10K0Q15Z_C881285.pdf; ComponentLink2Description: JLCPCB Part URL; ComponentLink2URL: https://jlcpcb.com/partdetail/C881285
pins: 1, 2
1 alternate drawing of the same symbol

## CR0201JH0000G
designator R?  Resistance: 0Ω  (hidden comment: *)
Resistor, 0Ω, ±5%, 50mW, 25V, -55℃~+125℃, SMD 0201; Manufacturer: Uniroyal; Manufacturer Part Number: CR0201JH0000G; Supplier 1: LCSC; Supplier Part Number 1: C100147; JLCPCB Part Number: C100147; Power Rating: 50mW; Category: Resistors; Package Size: 0201; JLCPCB Basic Part: Yes; Tolerance: ±5%; Voltage Rating: 25V; Temperature Rating: -55℃~+125℃; ComponentLink1Description: Datasheet; ComponentLink1URL: https://wmsc.lcsc.com/wmsc/upload/file/pdf/v2/lcsc/2304140030_LIZ-Elec-CR0201JH0000G_C100147.pdf; ComponentLink2Description: JLCPCB Part URL; ComponentLink2URL: https://jlcpcb.com/partdetail/C100147
pins: 1, 2
1 alternate drawing of the same symbol

## CR0201JH0101G
designator R?  Resistance: 100Ω  (hidden comment: *)
Resistor, 100Ω, ±5%, 50mW, 25V, ±250ppm/℃, -55℃~+125℃, SMD 0201; Manufacturer: Uniroyal; Manufacturer Part Number: CR0201JH0101G; Supplier 1: LCSC; Supplier Part Number 1: C100149; JLCPCB Part Number: C100149; Power Rating: 50mW; Category: Resistors; Package Size: 0201; JLCPCB Basic Part: Yes; Tolerance: ±5%; Voltage Rating: 25V; Temperature Coefficient: ±250ppm/℃; Temperature Rating: -55℃~+125℃; ComponentLink1Description: Datasheet; ComponentLink1URL: https://wmsc.lcsc.com/wmsc/upload/file/pdf/v2/lcsc/2304140030_LIZ-Elec-CR0201JH0101G_C100149.pdf; ComponentLink2Description: JLCPCB Part URL; ComponentLink2URL: https://jlcpcb.com/partdetail/C100149
pins: 1, 2
1 alternate drawing of the same symbol

## CR0201JH0102G
designator R?  Resistance: 1kΩ  (hidden comment: *)
Resistor, 1kΩ, ±5%, 50mW, 25V, ±250ppm/℃, -55℃~+125℃, SMD 0201; Manufacturer: Uniroyal; Manufacturer Part Number: CR0201JH0102G; Supplier 1: LCSC; Supplier Part Number 1: C100150; JLCPCB Part Number: C100150; Power Rating: 50mW; Category: Resistors; Package Size: 0201; JLCPCB Basic Part: Yes; Tolerance: ±5%; Voltage Rating: 25V; Temperature Coefficient: ±250ppm/℃; Temperature Rating: -55℃~+125℃; ComponentLink1Description: Datasheet; ComponentLink1URL: https://wmsc.lcsc.com/wmsc/upload/file/pdf/v2/lcsc/2304140030_LIZ-Elec-CR0201JH0102G_C100150.pdf; ComponentLink2Description: JLCPCB Part URL; ComponentLink2URL: https://jlcpcb.com/partdetail/C100150
pins: 1, 2
1 alternate drawing of the same symbol

## CR0201JH0150G
designator R?  Resistance: 15Ω  (hidden comment: *)
Resistor, 15Ω, ±5%, 50mW, SMD 0201; Manufacturer: Uniroyal; Manufacturer Part Number: CR0201JH0150G; Supplier 1: LCSC; Supplier Part Number 1: C100152; JLCPCB Part Number: C100152; Power Rating: 50mW; Category: Resistors; Package Size: 0201; JLCPCB Basic Part: Yes; Tolerance: ±5%; ComponentLink1Description: Datasheet; ComponentLink1URL: https://wmsc.lcsc.com/wmsc/upload/file/pdf/v2/lcsc/2304140030_LIZ-Elec-CR0201JH0150G_C100152.pdf; ComponentLink2Description: JLCPCB Part URL; ComponentLink2URL: https://jlcpcb.com/partdetail/C100152
pins: 1, 2
1 alternate drawing of the same symbol

## CR0201JH0153G
designator R?  Resistance: 15kΩ  (hidden comment: *)
Resistor, 15kΩ, ±5%, 50mW, 25V, ±250ppm/℃, -55℃~+125℃, SMD 0201; Manufacturer: Uniroyal; Manufacturer Part Number: CR0201JH0153G; Supplier 1: LCSC; Supplier Part Number 1: C100154; JLCPCB Part Number: C100154; Power Rating: 50mW; Category: Resistors; Package Size: 0201; JLCPCB Basic Part: Yes; Tolerance: ±5%; Voltage Rating: 25V; Temperature Coefficient: ±250ppm/℃; Temperature Rating: -55℃~+125℃; ComponentLink1Description: Datasheet; ComponentLink1URL: https://wmsc.lcsc.com/wmsc/upload/file/pdf/v2/lcsc/2304140030_LIZ-Elec-CR0201JH0153G_C100154.pdf; ComponentLink2Description: JLCPCB Part URL; ComponentLink2URL: https://jlcpcb.com/partdetail/C100154
pins: 1, 2
1 alternate drawing of the same symbol

## CR0201JH0274G
designator R?  Resistance: 270kΩ  (hidden comment: *)
Resistor, 270kΩ, ±5%, 50mW, 25V, SMD 0201; Manufacturer: Uniroyal; Manufacturer Part Number: CR0201JH0274G; Supplier 1: LCSC; Supplier Part Number 1: C3037024; JLCPCB Part Number: C3037024; Power Rating: 50mW; Category: Resistors; Package Size: 0201; JLCPCB Basic Part: Yes; Tolerance: ±5%; Voltage Rating: 25V; ComponentLink1Description: Datasheet; ComponentLink1URL: https://wmsc.lcsc.com/wmsc/upload/file/pdf/v2/lcsc/2207011200_LIZ-Elec-CR0201JH0274G_C3037024.pdf; ComponentLink2Description: JLCPCB Part URL; ComponentLink2URL: https://jlcpcb.com/partdetail/C3037024
pins: 1, 2
1 alternate drawing of the same symbol

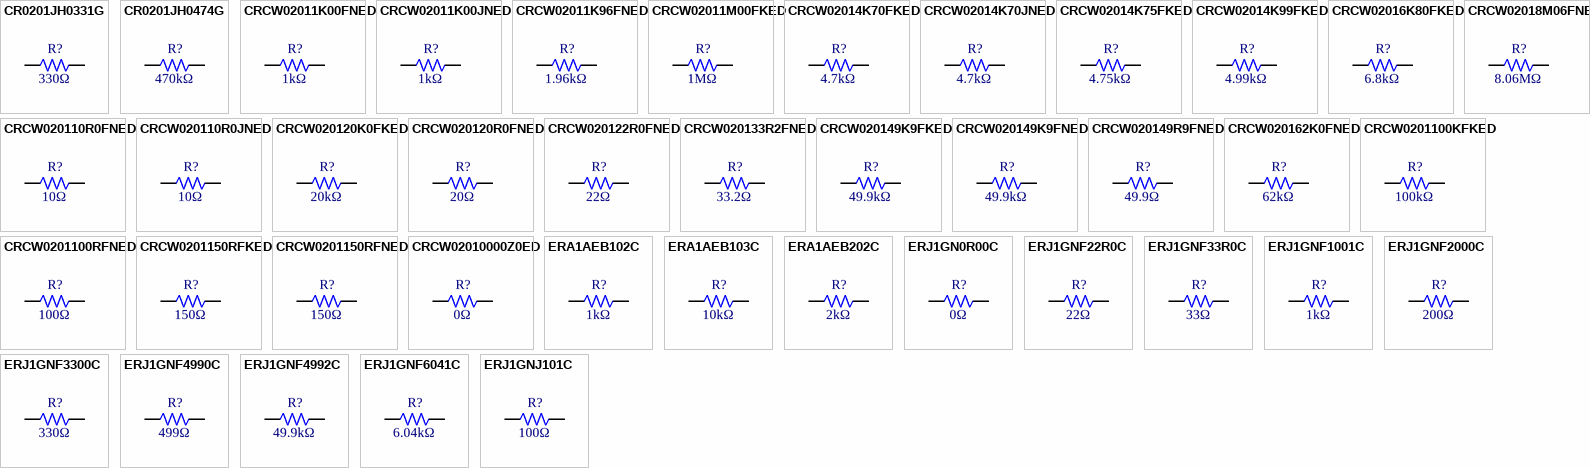
[diagram p12: symbols CR0201JH0331G to ERJ1GNJ101C]

## CR0201JH0331G
designator R?  Resistance: 330Ω  (hidden comment: *)
Resistor, 330Ω, ±5%, SMD 0201; Manufacturer: Uniroyal; Manufacturer Part Number: CR0201JH0331G; Supplier 1: LCSC; Supplier Part Number 1: C100175; JLCPCB Part Number: C100175; Category: Resistors; Package Size: 0201; JLCPCB Basic Part: Yes; Tolerance: ±5%; ComponentLink1Description: Datasheet; ComponentLink1URL: https://wmsc.lcsc.com/wmsc/upload/file/pdf/v2/lcsc/2304140030_LIZ-Elec-CR0201JH0331G_C100175.pdf; ComponentLink2Description: JLCPCB Part URL; ComponentLink2URL: https://jlcpcb.com/partdetail/C100175
pins: 1, 2
1 alternate drawing of the same symbol
